# Altium footprint library Miscellaneous THD.PcbLib: 216 footprints (part 8 of 15) (continued)
## JYEBAO_SMA8410L-0000 [mm] "50 Ohm SMA Straight PCB Jack"
height 22.87
pads (5):
  round 2.2 hole 1.5: 1(0,0) 2(-2.54,-2.54) 2(-2.54,2.54) 2(2.54,-2.54) 2(2.54,2.54)
Top Overlay:
  circle w0.2: c0,0 r5.1
  lines w0.2: -3.574,-1.518 -4.45,0 -3.574,1.518 ; -2.236,-1.118 cw(c0,0) -2.236,1.118 ; -1.957,-1.208 cw(c0,0) -1.957,1.208 ; -1.917,-3.854 1.917,-3.854 ; -1.917,3.854 1.917,3.854 ; -1.208,-1.957 ccw(c0,0) 1.208,-1.957 ; -1.208,1.957 cw(c0,0) 1.208,1.957 ; -1.118,-2.236 ccw(c0,0) 1.118,-2.236 ; -1.118,2.236 cw(c0,0) 1.118,2.236 ; 1.957,-1.208 ccw(c0,0) 1.957,1.208 ; 2.236,-1.118 ccw(c0,0) 2.236,1.118 ; 3.574,-1.518 4.45,0 3.574,1.518
Mechanical 8:
  circle w0.1: c0,0 r1.454
  circle w0.1: c-2.54,-2.54 r1.1
  circle w0.1: c-2.54,-2.54 r0.75
  lines w0.1: -3.04,-2.54 -2.54,-2.54 ; -3.04,2.54 -2.54,2.54 ; -2.54,-3.04 -2.54,-2.54 ; -2.54,-2.04 -2.54,-2.54 ; -2.54,2.04 -2.54,2.54 ; -2.54,3.04 -2.54,2.54 ; -2.04,-2.54 -2.54,-2.54 ; -2.04,2.54 -2.54,2.54 ; -0.5,0 0,0 ; 0,-0.5 0,0 ; 0,0.5 0,0 ; 0.5,0 0,0 ; 2.04,-2.54 2.54,-2.54 ; 2.04,2.54 2.54,2.54 ; 2.54,-3.04 2.54,-2.54 ; 2.54,-2.04 2.54,-2.54 ; 2.54,2.04 2.54,2.54 ; 2.54,3.04 2.54,2.54 ; 3.04,-2.54 2.54,-2.54 ; 3.04,2.54 2.54,2.54
Mechanical 14:
  circle w0.1: c0,0 r2.3
  circle w0.1: c0,0 r2.5
  circle w0.1: c0,0 r0.6
  circle w0.1: c0,0 r2.3
  circle w0.1: c0,0 r5.1
  lines w0.1: -4.45,0 -2.225,3.854 2.225,3.854 4.45,0 2.225,-3.854 -2.225,-3.854 -4.45,0
3D body "JYEBAO_SMA8410L-0000_Part2.stp": height 17.8, standoff 14.6, extent -5.1,-5.099 5.1,5.099
3D body "JYEBAO_SMA8410L-0000_Part1.stp": height 22.87, standoff -3.94, extent -3.5,-3.5 3.5,3.5

## KEL_8901-068-177L-0046 [mm] "68 Positions, Pitch 1.27mm, Right angle PCB Receptacle With flanges and hooks"
height 7
pads (70):
  round 1.5 hole 0.8: 1(-20.955,0) 3(-19.685,1.905) 5(-18.415,0) 7(-17.145,1.905) 9(-15.875,0) 11(-14.605,1.905) 13(-13.335,0) 15(-12.065,1.905) 17(-10.795,0) 19(-9.525,1.905) 21(-8.255,0) 23(-6.985,1.905) 25(-5.715,0) 27(-4.445,1.905) 29(-3.175,0) 31(-1.905,1.905) 33(-0.635,0) 35(0.635,1.905) 37(1.905,0) 39(3.175,1.905) 41(4.445,0) 43(5.715,1.905) 45(6.985,0) 47(8.255,1.905) 49(9.525,0) 51(10.795,1.905) 53(12.065,0) 55(13.335,1.905) 57(14.605,0) 59(15.875,1.905) 61(17.145,0) 63(18.415,1.905) 65(19.685,0) 67(20.955,1.905)
  round 1.1 hole 0.65: 2(-20.955,-1.905) 4(-19.685,-1.905) 6(-18.415,-1.905) 8(-17.145,-1.905) 10(-15.875,-1.905) 12(-14.605,-1.905) 14(-13.335,-1.905) 16(-12.065,-1.905) 18(-10.795,-1.905) 20(-9.525,-1.905) 22(-8.255,-1.905) 24(-6.985,-1.905) 26(-5.715,-1.905) 28(-4.445,-1.905) 30(-3.175,-1.905) 32(-1.905,-1.905) 34(-0.635,-1.905) 36(0.635,-1.905) 38(1.905,-1.905) 40(3.175,-1.905) 42(4.445,-1.905) 44(5.715,-1.905) 46(6.985,-1.905) 48(8.255,-1.905) 50(9.525,-1.905) 52(10.795,-1.905) 54(12.065,-1.905) 56(13.335,-1.905) 58(14.605,-1.905) 60(15.875,-1.905) 62(17.145,-1.905) 64(18.415,-1.905) 66(19.685,-1.905) 68(20.955,-1.905)
  round 3 hole 2.3: 69(-25.4,0) 70(25.4,0)
Top Overlay:
  lines w0.2: -27.955,-2.105 -23.955,-2.105 -23.955,-1.155 ; -26.955,-5.635 -26.955,-2.105 ; -23.955,-7.105 23.955,-7.105 ; -23.955,-4.105 -23.955,-7.905 -23.155,-7.905 -23.155,-4.105 ; -23.955,1.155 -23.955,2.895 ; -22.43,2.895 -22.43,-2.905 22.43,-2.905 22.43,2.895 ; -20.164,2.895 -27.955,2.895 -27.955,-5.635 -25.855,-5.635 -25.855,-4.105 25.855,-4.105 25.855,-5.635 27.955,-5.635 27.955,2.895 21.434,2.895 ; 23.155,-4.105 23.155,-7.905 23.955,-7.905 23.955,-4.105 ; 23.955,-1.155 23.955,-2.105 27.955,-2.105 ; 23.955,1.155 23.955,2.895 ; -21.455,-3.15 -20.955,-4.15 -20.455,-3.15 -21.455,-3.15
Mechanical 8:
  drawing of 536 lines, arcs and shapes, not listed
  text "PCB Edge" at -3.81,-5.08 h1
Mechanical 14:
  lines w0.1: -27.955,-2.105 -23.955,-2.105 -23.955,2.895 ; -26.955,-5.635 -26.955,-2.105 ; -23.955,-7.105 23.955,-7.105 ; -23.955,-4.105 -23.955,-7.905 -23.155,-7.905 -23.155,-4.105 ; -22.43,2.895 -22.43,-2.905 22.43,-2.905 22.43,2.895 ; -21.155,-2.905 -21.155,0.125 -20.755,0.125 -20.755,-2.905 ; -19.885,-2.905 -19.885,2.016 -19.485,2.03 -19.485,-2.905 ; -18.615,-2.905 -18.615,0.125 -18.215,0.125 -18.215,-2.905 ; -17.345,-2.905 -17.345,2.016 -16.945,2.03 -16.945,-2.905 ; -16.075,-2.905 -16.075,0.125 -15.675,0.125 -15.675,-2.905 ; -14.805,-2.905 -14.805,2.016 -14.405,2.03 -14.405,-2.905 ; -13.535,-2.905 -13.535,0.125 -13.135,0.125 -13.135,-2.905 ; -12.265,-2.905 -12.265,2.016 -11.865,2.03 -11.865,-2.905 ; -10.995,-2.905 -10.995,0.125 -10.595,0.125 -10.595,-2.905 ; -9.725,-2.905 -9.725,2.03 -9.325,2.03 -9.325,-2.905 ; -8.455,-2.905 -8.455,0.125 -8.055,0.125 -8.055,-2.905 ; -7.185,-2.905 -7.185,2.016 -6.785,2.03 -6.785,-2.905 ; -5.915,-2.905 -5.915,0.125 -5.515,0.125 -5.515,-2.905 ; -4.645,-2.905 -4.645,2.03 -4.245,2.03 -4.245,-2.905 ; -3.375,-2.905 -3.375,0.125 -2.975,0.125 -2.975,-2.905 ; -2.105,-2.905 -2.105,2.016 -1.705,2.03 -1.705,-2.905 ; -0.835,-2.905 -0.835,0.125 -0.435,0.125 -0.435,-2.905 ; 0.435,-2.905 0.435,2.03 0.835,2.03 0.835,-2.905 ; 1.705,-2.905 1.705,0.125 2.105,0.125 2.105,-2.905 ; 2.975,-2.905 2.975,2.016 3.375,2.03 3.375,-2.905 ; 4.245,-2.905 4.245,0.125 4.645,0.125 4.645,-2.905 ; 5.515,-2.905 5.515,2.03 5.915,2.03 5.915,-2.905 ; 6.785,-2.905 6.785,0.125 7.185,0.125 7.185,-2.905 ; 8.055,-2.905 8.055,2.016 8.455,2.03 8.455,-2.905 ; 9.325,-2.905 9.325,0.125 9.725,0.125 9.725,-2.905 ; 10.595,-2.905 10.595,2.03 10.995,2.03 10.995,-2.905 ; 11.865,-2.905 11.865,0.125 12.265,0.125 12.265,-2.905 ; 13.135,-2.905 13.135,2.016 13.535,2.03 13.535,-2.905 ; 14.405,-2.905 14.405,0.125 14.805,0.125 14.805,-2.905 ; 15.675,-2.905 15.675,2.03 16.075,2.03 16.075,-2.905 ; 16.945,-2.905 16.945,0.125 17.345,0.125 17.345,-2.905 ; 18.215,-2.905 18.215,2.016 18.615,2.03 18.615,-2.905 ; 19.485,-2.905 19.485,0.125 19.885,0.125 19.885,-2.905 ; 20.755,-2.905 20.755,2.03 21.155,2.03 21.155,-2.905 ; 23.155,-4.105 23.155,-7.905 23.955,-7.905 23.955,-4.105 ; 23.955,2.895 23.955,-2.105 27.955,-2.105 ; -27.955,-5.635 -25.855,-5.635 -25.855,-4.105 25.855,-4.105 25.855,-5.635 27.955,-5.635 27.955,2.895 -27.955,2.895 -27.955,-5.635 ; -21.455,-3.15 -20.955,-4.15 -20.455,-3.15 -21.455,-3.15
3D body "KEL_8901-068-177L-0046.stp": height 7.05, standoff -3, extent -27.955,-7.905 27.955,2.895

## KEL_8931E-068-178L-F [mm] "68 Positions, Pitch 1.27mm, Right angle PCB Plug"
height 7
pads (70):
  round 1.5 hole 0.8: 1(20.955,1.905) 3(19.685,0) 5(18.415,1.905) 7(17.145,0) 9(15.875,1.905) 11(14.605,0) 13(13.335,1.905) 15(12.065,0) 17(10.795,1.905) 19(9.525,0) 21(8.255,1.905) 23(6.985,0) 25(5.715,1.905) 27(4.445,0) 29(3.175,1.905) 31(1.905,0) 33(0.635,1.905) 35(-0.635,0) 37(-1.905,1.905) 39(-3.175,0) 41(-4.445,1.905) 43(-5.715,0) 45(-6.985,1.905) 47(-8.255,0) 49(-9.525,1.905) 51(-10.795,0) 53(-12.065,1.905) 55(-13.335,0) 57(-14.605,1.905) 59(-15.875,0) 61(-17.145,1.905) 63(-18.415,0) 65(-19.685,1.905) 67(-20.955,0)
  round 1.1 hole 0.65: 2(20.955,-1.905) 4(19.685,-1.905) 6(18.415,-1.905) 8(17.145,-1.905) 10(15.875,-1.905) 12(14.605,-1.905) 14(13.335,-1.905) 16(12.065,-1.905) 18(10.795,-1.905) 20(9.525,-1.905) 22(8.255,-1.905) 24(6.985,-1.905) 26(5.715,-1.905) 28(4.445,-1.905) 30(3.175,-1.905) 32(1.905,-1.905) 34(0.635,-1.905) 36(-0.635,-1.905) 38(-1.905,-1.905) 40(-3.175,-1.905) 42(-4.445,-1.905) 44(-5.715,-1.905) 46(-6.985,-1.905) 48(-8.255,-1.905) 50(-9.525,-1.905) 52(-10.795,-1.905) 54(-12.065,-1.905) 56(-13.335,-1.905) 58(-14.605,-1.905) 60(-15.875,-1.905) 62(-17.145,-1.905) 64(-18.415,-1.905) 66(-19.685,-1.905) 68(-20.955,-1.905)
  round 3 hole 2.3: 69(-25.4,0) 70(25.4,0)
Top Overlay:
  lines w0.2: -22.355,2.895 -22.355,-2.905 22.355,-2.905 22.355,2.895 ; -20.164,2.895 -27.955,2.895 -27.955,-7.105 27.955,-7.105 27.955,2.895 21.434,2.895 ; 20.455,-3.805 21.455,-3.805 20.955,-4.805 20.455,-3.805
  text "1" at 21.455,3.512 h1
Mechanical 8:
  drawing of 304 lines, arcs and shapes, not listed
  text "PCB Edge" at -6.396,-5.115 h1
Mechanical 14:
  lines w0.1: -22.355,2.895 -22.355,-2.905 22.355,-2.905 22.355,2.895 ; -21.155,-2.905 -21.155,0.125 -20.755,0.125 -20.755,-2.905 ; -19.885,-2.905 -19.885,2.016 -19.485,2.03 -19.485,-2.905 ; -18.615,-2.905 -18.615,0.125 -18.215,0.125 -18.215,-2.905 ; -17.345,-2.905 -17.345,2.016 -16.945,2.03 -16.945,-2.905 ; -16.075,-2.905 -16.075,0.125 -15.675,0.125 -15.675,-2.905 ; -14.805,-2.905 -14.805,2.016 -14.405,2.03 -14.405,-2.905 ; -13.535,-2.905 -13.535,0.125 -13.135,0.125 -13.135,-2.905 ; -12.265,-2.905 -12.265,2.016 -11.865,2.03 -11.865,-2.905 ; -10.995,-2.905 -10.995,0.125 -10.595,0.125 -10.595,-2.905 ; -9.725,-2.905 -9.725,2.03 -9.325,2.03 -9.325,-2.905 ; -8.455,-2.905 -8.455,0.125 -8.055,0.125 -8.055,-2.905 ; -7.185,-2.905 -7.185,2.016 -6.785,2.03 -6.785,-2.905 ; -5.915,-2.905 -5.915,0.125 -5.515,0.125 -5.515,-2.905 ; -4.645,-2.905 -4.645,2.03 -4.245,2.03 -4.245,-2.905 ; -3.375,-2.905 -3.375,0.125 -2.975,0.125 -2.975,-2.905 ; -2.105,-2.905 -2.105,2.016 -1.705,2.03 -1.705,-2.905 ; -0.835,-2.905 -0.835,0.125 -0.435,0.125 -0.435,-2.905 ; 0.435,-2.905 0.435,2.03 0.835,2.03 0.835,-2.905 ; 1.705,-2.905 1.705,0.125 2.105,0.125 2.105,-2.905 ; 2.975,-2.905 2.975,2.016 3.375,2.03 3.375,-2.905 ; 4.245,-2.905 4.245,0.125 4.645,0.125 4.645,-2.905 ; 5.515,-2.905 5.515,2.03 5.915,2.03 5.915,-2.905 ; 6.785,-2.905 6.785,0.125 7.185,0.125 7.185,-2.905 ; 8.055,-2.905 8.055,2.016 8.455,2.03 8.455,-2.905 ; 9.325,-2.905 9.325,0.125 9.725,0.125 9.725,-2.905 ; 10.595,-2.905 10.595,2.03 10.995,2.03 10.995,-2.905 ; 11.865,-2.905 11.865,0.125 12.265,0.125 12.265,-2.905 ; 13.135,-2.905 13.135,2.016 13.535,2.03 13.535,-2.905 ; 14.405,-2.905 14.405,0.125 14.805,0.125 14.805,-2.905 ; 15.675,-2.905 15.675,2.03 16.075,2.03 16.075,-2.905 ; 16.945,-2.905 16.945,0.125 17.345,0.125 17.345,-2.905 ; 18.215,-2.905 18.215,2.016 18.615,2.03 18.615,-2.905 ; 19.485,-2.905 19.485,0.125 19.885,0.125 19.885,-2.905 ; 20.755,-2.905 20.755,2.03 21.155,2.03 21.155,-2.905 ; -27.955,-7.105 -27.955,2.895 27.955,2.895 27.955,-7.105 -27.955,-7.105 ; 20.455,-3.805 21.455,-3.805 20.955,-4.805 20.455,-3.805
  text "1" at 21.455,3.512 h1
3D body "KEL_8931E-068-178L-F.stp": height 7.05, standoff -3, extent -27.955,-7.105 27.955,2.895

## KYCON_KPJX-4S-S [mm] "48VDC 7.5A, 4 Position Shielded DC Power Jack"
height 15
pads (11):
  oval 1.3x3.4 hole 0.6 slot 2.7 at 90 deg: 1(2.9,-3.65) 2(-2.9,-3.65) 3(2.5,0) 4(-2.5,0) SHIELD(-7.8,-5) SHIELD(7.8,-5)
  round 1 hole 1.7 unplated mask+0.35: MECH(-2.5,3.5) MECH(2.5,3.5)
  round 2.9 hole 2.2: SHIELD(-7.8,3.5) SHIELD(7.8,3.5)
  oval 2.9x1.7 hole 1 slot 2.2 at 0 deg: SHIELD(0,5.5)
Top Overlay:
  circle w0.2: c0,-3.65 r1.725
  lines w0.2: -8,-6.1 -7.9,-6.1 -7.9,-6.5 6.851,-6.5 ; -8,-2.919 -8,1.661 ; -8,5.339 -8,6.99 8,6.99 8,5.339 ; -6.4,7 -6.4,11 6.4,11 6.4,7 ; 8,-2.919 8,1.661
  text "1" at 2.775,-8.075 h1
Mechanical 8:
  circle w0.1: c7.8,3.5 r1.85
  circle w0.1: c-7.8,3.5 r1.85
  circle w0.1: c-7.8,3.5 r1.45
  circle w0.1: c7.8,3.5 r1.45
  circle w0.1: c-7.8,3.5 r1.1
  circle w0.1: c7.8,3.5 r1.1
  circle w0.1: c-2.5,3.5 r1.2
  circle w0.1: c2.5,3.5 r1.2
  circle w0.1: c-2.5,3.5 r0.85
  circle w0.1: c2.5,3.5 r0.85
  lines w0.1: -8.3,-5 -7.8,-5 ; -8.3,3.5 -7.8,3.5 ; -7.8,-6.05 -7.5,-6.05 ; -7.8,-5.5 -7.8,-5 ; -7.8,-4.5 -7.8,-5 ; -7.8,-3.95 -7.5,-3.95 ; -7.8,3 -7.8,3.5 ; -7.8,4 -7.8,3.5 ; -7.3,-5 -7.8,-5 ; -7.3,3.5 -7.8,3.5 ; -3.4,-3.65 -2.9,-3.65 ; -3,0 -2.5,0 ; -3,3.5 -2.5,3.5 ; -2.9,-4.7 -2.6,-4.7 ; -2.9,-4.15 -2.9,-3.65 ; -2.9,-3.15 -2.9,-3.65 ; -2.9,-2.6 -2.6,-2.6 ; -2.5,-1.05 -2.2,-1.05 ; -2.5,-0.5 -2.5,0 ; -2.5,0.5 -2.5,0 ; -2.5,1.05 -2.2,1.05 ; -2.5,3 -2.5,3.5 ; -2.5,4 -2.5,3.5 ; -2.4,-3.65 -2.9,-3.65 ; -2,0 -2.5,0 ; -2,3.5 -2.5,3.5 ; -0.6,5.5 -0.6,6 ; -0.5,0 0,0 ; -0.5,5.5 0,5.5 ; 0,-0.5 0,0 ; 0,0.5 0,0 ; 0,3.5 0,11 0,5.5 ; 0,5 0,5.5 ; 0,6 0,5.5 ; 0.5,0 0,0 ; 0.5,5.5 0,5.5 ; 0.6,5.5 0.6,6 ; 2,0 2.5,0 ; 2,3.5 2.5,3.5 ; 2.4,-3.65 2.9,-3.65 ; 2.5,-1.05 2.8,-1.05 ; 2.5,-0.5 2.5,0 ; 2.5,0.5 2.5,0 ; 2.5,1.05 2.8,1.05 ; 2.5,3 2.5,3.5 ; 2.5,4 2.5,3.5 ; 2.9,-4.7 3.2,-4.7 ; 2.9,-4.15 2.9,-3.65 ; 2.9,-3.15 2.9,-3.65 ; 2.9,-2.6 3.2,-2.6 ; 3,0 2.5,0 ; 3,3.5 2.5,3.5 ; 3.4,-3.65 2.9,-3.65 ; 3.807,-4.145 4.202,-4.145 ; 4.005,-4.145 4.005,-3.078 4.187,-3.386 ; 7.3,-5 7.8,-5 ; 7.3,3.5 7.8,3.5 ; 7.8,-6.05 8.1,-6.05 ; 7.8,-5.5 7.8,-5 ; 7.8,-4.5 7.8,-5 ; 7.8,-3.95 8.1,-3.95 ; 7.8,3 7.8,3.5 ; 7.8,4 7.8,3.5 ; 8.3,-5 7.8,-5 ; 8.3,3.5 7.8,3.5 ; -7.5,-6.05 cw(c-7.8,-6.05) -8.1,-6.05 -8.1,-3.95 cw(c-7.8,-3.95) -7.5,-3.95 ; -7.5,-6.05 -7.5,-3.95 ; -2.6,-4.7 cw(c-2.9,-4.7) -3.2,-4.7 -3.2,-2.6 cw(c-2.9,-2.6) -2.6,-2.6 ; -2.6,-4.7 -2.6,-2.6 ; -2.2,-1.05 cw(c-2.5,-1.05) -2.8,-1.05 -2.8,1.05 cw(c-2.5,1.05) -2.2,1.05 ; -2.2,-1.05 -2.2,1.05 ; -0.6,6 ccw(c-0.6,5.5) -0.6,5 0.6,5 ccw(c0.6,5.5) 0.6,6 ; -0.6,6 0.6,6 ; 2.8,-1.05 cw(c2.5,-1.05) 2.2,-1.05 2.2,1.05 cw(c2.5,1.05) 2.8,1.05 ; 2.8,-1.05 2.8,1.05 ; 3.2,-4.7 cw(c2.9,-4.7) 2.6,-4.7 2.6,-2.6 cw(c2.9,-2.6) 3.2,-2.6 ; 3.2,-4.7 3.2,-2.6 ; 8.1,-6.05 cw(c7.8,-6.05) 7.5,-6.05 7.5,-3.95 cw(c7.8,-3.95) 8.1,-3.95 ; 8.1,-6.05 8.1,-3.95 ; -8.85,-6.05 ccw(c-7.8,-6.05) -6.75,-6.05 -6.75,-3.95 ccw(c-7.8,-3.95) -8.85,-3.95 -8.85,-6.05 ; -8.45,-6.05 ccw(c-7.8,-6.05) -7.15,-6.05 -7.15,-3.95 ccw(c-7.8,-3.95) -8.45,-3.95 -8.45,-6.05 ; -3.55,-4.7 ccw(c-2.9,-4.7) -2.25,-4.7 -2.25,-2.6 ccw(c-2.9,-2.6) -3.55,-2.6 -3.55,-4.7 ; -3.15,-1.05 ccw(c-2.5,-1.05) -1.85,-1.05 -1.85,1.05 ccw(c-2.5,1.05) -3.15,1.05 -3.15,-1.05 ; -0.6,4.65 cw(c-0.6,5.5) -0.6,6.35 0.6,6.35 cw(c0.6,5.5) 0.6,4.65 -0.6,4.65 ; 1.85,-1.05 ccw(c2.5,-1.05) 3.15,-1.05 3.15,1.05 ccw(c2.5,1.05) 1.85,1.05 1.85,-1.05 ; 2.25,-4.7 ccw(c2.9,-4.7) 3.55,-4.7 3.55,-2.6 ccw(c2.9,-2.6) 2.25,-2.6 2.25,-4.7 ; 6.75,-6.05 ccw(c7.8,-6.05) 8.85,-6.05 8.85,-3.95 ccw(c7.8,-3.95) 6.75,-3.95 6.75,-6.05 ; 7.15,-6.05 ccw(c7.8,-6.05) 8.45,-6.05 8.45,-3.95 ccw(c7.8,-3.95) 7.15,-3.95 7.15,-6.05
Mechanical 14:
  circle w0.1: c0,-3.65 r1.725
  lines w0.1: -6.4,7 -6.4,11 6.4,11 6.4,7 ; -8,-6.1 -8,6.99 8,6.99 8,-6.1 7.9,-6.1 7.9,-6.5 -7.9,-6.5 -7.9,-6.1 -8,-6.1
  text "2" at -4.65,-4.075 h1
  text "4" at -4.25,-0.425 h1
  text "3" at 3.6,-0.5 h1
  text "1" at 4.005,-4.145 h1
3D body "KYCON_KPJX-4S-S.stp": height 15, standoff -3.5, extent -8,-6.5 8,11

## MHCONNECTORS_3700-0121-01 [mm] "68 contacts, Pitch .050\", Right Angled  SCSI Header (Threaded  M2.5)"
height 9.4
pads (70):
  round 3.5 hole 2.8: 69(-28.965,-0.953) 70(28.965,-0.953)
  round 1.55 hole 0.85: A1(-20.955,2.858) A2(-19.685,0.953) A3(-18.415,2.858) A4(-17.145,0.953) A5(-15.875,2.858) A6(-14.605,0.953) A7(-13.335,2.858) A8(-12.065,0.952) A9(-10.795,2.858) A10(-9.525,0.953) A11(-8.255,2.858) A12(-6.985,0.953) A13(-5.715,2.858) A14(-4.445,0.953) A15(-3.175,2.858) A16(-1.905,0.953) A17(-0.635,2.858) A18(0.635,0.953) A19(1.905,2.858) A20(3.175,0.953) A21(4.445,2.858) A22(5.715,0.953) A23(6.985,2.858) A24(8.255,0.953) A25(9.525,2.858) A26(10.795,0.953) A27(12.065,2.858) A28(13.335,0.953) A29(14.605,2.858) A30(15.875,0.953) A31(17.145,2.858) A32(18.415,0.953) A33(19.685,2.858) A34(20.955,0.953) B1(-20.955,-0.953) B2(-19.685,-2.858) B3(-18.415,-0.953) B4(-17.145,-2.858) B5(-15.875,-0.953) B6(-14.605,-2.858) B7(-13.335,-0.953) B8(-12.065,-2.858) B9(-10.795,-0.953) B10(-9.525,-2.858) B11(-8.255,-0.953) B12(-6.985,-2.858) B13(-5.715,-0.953) B14(-4.445,-2.858) B15(-3.175,-0.953) B16(-1.905,-2.858) B17(-0.635,-0.953) B18(0.635,-2.858) B19(1.905,-0.953) B20(3.175,-2.858) B21(4.445,-0.953) B22(5.715,-2.858) B23(6.985,-0.953) B24(8.255,-2.858) B25(9.525,-0.953) B26(10.795,-2.858) B27(12.065,-0.953) B28(13.335,-2.858) B29(14.605,-0.953) B30(15.875,-2.858) B31(17.145,-0.953) B32(18.415,-2.858) B33(19.685,-0.953) B34(20.955,-2.858)
Top Overlay:
  circle w0.3: c-20.9,4.75 r0.15
  lines w0.2: -32.08,-4.108 32.08,-4.108 ; -26.28,-4.108 -26.28,0.393 -24.5,0.393 ; -25.6,-7.658 -25.6,-11.358 -26.7,-11.358 -26.7,-12.057 -25.6,-12.057 ccw(c-25.6,-11.358) -24.9,-11.358 -24.886,-7.658 ; -23.69,-7.658 -23.69,-12.207 ccw(c-23.14,-12.207) -23.14,-12.757 23.14,-12.758 ccw(c23.14,-12.207) 23.69,-12.207 23.69,-7.658 ; 24.9,-7.658 24.9,-11.358 ccw(c25.6,-11.358) 25.6,-12.058 26.7,-12.057 26.7,-11.358 25.6,-11.358 25.6,-7.658 ; 25.9,0.393 26.65,0.393 26.65,-4.108 ; -32.08,-7.658 32.08,-7.658 32.08,4.243 -32.08,4.243 -32.08,-7.658
  text "A34" at 22.4,0.485 h1
  text "B33" at 22.4,-1.415 h1
  text "B34" at 22.4,-3.365 h1
  text "A33" at 22.4,2.335 h1
  text "B2" at -23.65,-3.25 h1
  text "A1" at -23.65,2.25 h1
  text "A2" at -23.65,0.5 h1
  text "B1" at -23.65,-1.5 h1
Mechanical 8:
  drawing of 286 lines, arcs and shapes, not listed
Mechanical 14:
  lines w0.1: -32.08,-4.108 32.08,-4.108 ; -26.28,-4.108 -26.28,0.393 -23.85,0.393 -23.85,-4.108 ; -25.6,-7.658 -25.6,-11.358 -26.7,-11.358 -26.7,-12.057 -25.6,-12.057 ccw(c-25.6,-11.358) -24.9,-11.358 -24.886,-7.658 ; -23.69,-7.658 -23.69,-12.207 ccw(c-23.14,-12.207) -23.14,-12.757 23.14,-12.758 ccw(c23.14,-12.207) 23.69,-12.207 23.69,-7.658 ; -21.18,-4.108 -21.18,3.057 -20.73,3.057 -20.73,-4.108 ; -19.91,-4.108 -19.91,1.152 -19.46,1.152 -19.46,-4.108 ; -18.64,-4.108 -18.64,3.057 -18.19,3.057 -18.19,-4.108 ; -17.37,-4.108 -17.37,1.152 -16.92,1.152 -16.92,-4.108 ; -16.1,-4.108 -16.1,3.057 -15.65,3.057 -15.65,-4.108 ; -14.83,-4.108 -14.83,1.152 -14.38,1.152 -14.38,-4.108 ; -13.56,-4.108 -13.56,3.057 -13.11,3.057 -13.11,-4.108 ; -12.29,-4.108 -12.29,1.152 -11.84,1.152 -11.84,-4.108 ; -11.02,-4.108 -11.02,3.057 -10.57,3.057 -10.57,-4.108 ; -9.75,-4.108 -9.75,1.152 -9.3,1.152 -9.3,-4.108 ; -8.48,-4.108 -8.48,3.057 -8.03,3.057 -8.03,-4.108 ; -7.21,-4.108 -7.21,1.152 -6.76,1.152 -6.76,-4.108 ; -5.94,-4.108 -5.94,3.057 -5.49,3.057 -5.49,-4.108 ; -4.67,-4.108 -4.67,1.152 -4.22,1.152 -4.22,-4.108 ; -3.4,-4.108 -3.4,3.057 -2.95,3.057 -2.95,-4.108 ; -2.13,-4.108 -2.13,1.152 -1.68,1.152 -1.68,-4.108 ; -0.86,-4.108 -0.86,3.057 -0.41,3.057 -0.41,-4.108 ; 0.41,-4.108 0.41,1.152 0.86,1.152 0.86,-4.108 ; 1.68,-4.108 1.68,3.057 2.13,3.057 2.13,-4.108 ; 2.95,-4.108 2.95,1.152 3.4,1.152 3.4,-4.108 ; 4.22,-4.108 4.22,3.057 4.67,3.057 4.67,-4.108 ; 5.49,-4.108 5.49,1.152 5.94,1.152 5.94,-4.108 ; 6.76,-4.108 6.76,3.057 7.21,3.057 7.21,-4.108 ; 8.03,-4.108 8.03,1.152 8.48,1.152 8.48,-4.108 ; 9.3,-4.108 9.3,3.057 9.75,3.057 9.75,-4.108 ; 10.57,-4.108 10.57,1.152 11.02,1.152 11.02,-4.108 ; 11.84,-4.108 11.84,3.057 12.29,3.057 12.29,-4.108 ; 13.11,-4.108 13.11,1.152 13.56,1.152 13.56,-4.108 ; 14.38,-4.108 14.38,3.057 14.83,3.057 14.83,-4.108 ; 15.65,-4.108 15.65,1.152 16.1,1.152 16.1,-4.108 ; 16.92,-4.108 16.92,3.057 17.37,3.057 17.37,-4.108 ; 18.19,-4.108 18.19,1.152 18.64,1.152 18.64,-4.108 ; 19.46,-4.108 19.46,3.057 19.91,3.057 19.91,-4.108 ; 20.73,-4.108 20.73,1.152 21.18,1.152 21.18,-4.108 ; 23.85,-4.108 23.85,0.393 26.65,0.393 26.65,-4.108 ; 24.9,-7.658 24.9,-11.358 ccw(c25.6,-11.358) 25.6,-12.058 26.7,-12.057 26.7,-11.358 25.6,-11.358 25.6,-7.658 ; -32.08,-7.658 32.08,-7.658 32.08,4.243 -32.08,4.243 -32.08,-7.658
  text "A34" at 22.4,0.485 h1.02
  text "B33" at 22.4,-1.415 h1.02
  text "B34" at 22.4,-3.365 h1.02
  text "A33" at 22.4,2.335 h1.02
  text "B2" at -23.65,-3.25 h1.02
  text "A1" at -23.65,2.25 h1.02
  text "A2" at -23.65,0.5 h1.02
  text "B1" at -23.65,-1.5 h1.02
3D body "MHCONNECTORS_3700-0121-01.stp": height 9.4, standoff -3.8, extent -32.08,-12.758 32.08,4.243

## MHCONNECTORS_MHRJJ66NFRA [mm] "RJ12 Connector, 6P6C, MHRJJ Series, Right Angle With Ears"
height 16
pads (8):
  round 1.6 hole 0.9: 1(3.175,-1.27) 2(1.905,1.27) 3(0.635,-1.27) 4(-0.635,1.27) 5(-1.905,-1.27) 6(-3.175,1.27)
  round 1 hole 3.2 unplated mask+1.1: M1(-5.08,7.62) M2(5.08,7.62)
Top Overlay:
  lines w0.2: -6.605,1.27 -4.325,1.27 ; -6.605,5.645 -6.605,-2.27 -2.535,-2.27 ; -6.605,9.595 -6.605,18.33 6.605,18.33 6.605,9.595 ; -1.275,-2.27 0.005,-2.27 ; 1.265,-2.27 2.545,-2.27 ; 3.055,1.27 6.605,1.27 ; 3.805,-2.27 6.605,-2.27 6.605,5.645
  text "1" at 3.145,-4.2 h1.2
Mechanical 8:
  circle w0.05: c1.905,1.27 r0.45
  circle w0.05: c-0.635,1.27 r0.45
  circle w0.05: c-3.175,1.27 r0.45
  circle w0.05: c3.175,-1.27 r0.45
  circle w0.05: c0.635,-1.27 r0.45
  circle w0.05: c-1.905,-1.27 r0.45
  circle w0.05: c5.08,7.62 r1.625
  circle w0.05: c-5.08,7.62 r1.625
  lines w0.05: -5.58,7.62 -5.08,7.62 ; -5.08,7.12 -5.08,7.62 ; -5.08,8.12 -5.08,7.62 ; -4.58,7.62 -5.08,7.62 ; -3.675,1.27 -3.175,1.27 ; -3.175,0.77 -3.175,1.27 ; -3.175,1.77 -3.175,1.27 ; -2.675,1.27 -3.175,1.27 ; -2.405,-1.27 -1.905,-1.27 ; -1.905,-1.77 -1.905,-1.27 ; -1.905,-0.77 -1.905,-1.27 ; -1.405,-1.27 -1.905,-1.27 ; -1.135,1.27 -0.635,1.27 ; -0.635,0.77 -0.635,1.27 ; -0.635,1.77 -0.635,1.27 ; -0.5,0 0,0 ; -0.135,1.27 -0.635,1.27 ; 0,-0.5 0,0 ; 0,0.5 0,0 ; 0.135,-1.27 0.635,-1.27 ; 0.5,0 0,0 ; 0.635,-1.77 0.635,-1.27 ; 0.635,-0.77 0.635,-1.27 ; 1.135,-1.27 0.635,-1.27 ; 1.405,1.27 1.905,1.27 ; 1.905,0.77 1.905,1.27 ; 1.905,1.77 1.905,1.27 ; 2.405,1.27 1.905,1.27 ; 2.675,-1.27 3.175,-1.27 ; 3.175,-1.77 3.175,-1.27 ; 3.175,-0.77 3.175,-1.27 ; 3.675,-1.27 3.175,-1.27 ; 4.58,7.62 5.08,7.62 ; 5.08,7.12 5.08,7.62 ; 5.08,8.12 5.08,7.62 ; 5.58,7.62 5.08,7.62
Mechanical 14:
  lines w0.1: -6.605,1.27 6.605,1.27 ; -6.605,-2.27 6.605,-2.27 6.605,18.33 -6.605,18.33 -6.605,8.62 -6.605,-2.27
  text "1" at 3.145,-4.2 h1.2
3D body "MHCONNECTORS_MHRJJ66NFRA.stp": height 16.01, standoff -3.6, extent -6.605,-2.27 6.605,18.33

## MIL-MAX_851-43-004-20-001000 [mm] "1.27mm Pitch SIL Right Angled Socket"
height 2.21
pads (4):
  rrect50% 1.1x1.1 hole 0.6: 1(-1.905,0) 2(-0.635,0) 3(0.635,0) 4(1.905,0)
Top Overlay:
  circle w0.3: c-3.058,0.003 r0.15
  lines w0.2: -2.129,0.923 -2.129,1.218 ; -1.68,0.923 -1.68,1.218 ; -0.859,0.923 -0.859,1.218 ; -0.41,0.923 -0.41,1.218 ; 0.41,0.923 0.41,1.218 ; 0.86,0.923 0.86,1.218 ; 1.68,0.923 1.68,1.218 ; 2.13,0.923 2.13,1.218 ; -2.731,1.218 -2.73,5.308 0,5.308 2.73,5.308 2.731,1.218 -2.731,1.218
Mechanical 8:
  lines w0.1: -2.405,0 -1.905,0 ; -1.905,-0.5 -1.905,0 ; -1.905,0.5 -1.905,0 ; -1.405,0 -1.905,0 ; -1.135,0 -0.635,0 ; -0.635,-0.5 -0.635,0 ; -0.635,0.5 -0.635,0 ; -0.354,-0.354 0,0 ; -0.354,0.354 0,0 ; -0.135,0 -0.635,0 ; 0.135,0 0.635,0 ; 0.354,-0.354 0,0 ; 0.354,0.354 0,0 ; 0.635,-0.5 0.635,0 ; 0.635,0.5 0.635,0 ; 1.135,0 0.635,0 ; 1.405,0 1.905,0 ; 1.905,-0.5 1.905,0 ; 1.905,0.5 1.905,0 ; 2.405,0 1.905,0
Mechanical 14:
  circle w0.3: c-3.058,0.003 r0.15
  lines w0.1: -2.129,1.218 -2.13,0 ccw(c-1.905,0) -1.68,0 -1.68,1.218 ; -0.859,1.218 -0.86,0 ccw(c-0.635,0) -0.41,0 -0.41,1.218 ; 0.41,1.218 0.41,0 ccw(c0.635,0) 0.86,0 0.86,1.218 ; 1.68,1.218 1.68,0 ccw(c1.905,0) 2.13,0 2.13,1.218 ; -2.731,1.218 -2.73,5.308 0,5.308 2.73,5.308 2.731,1.218 -2.731,1.218
3D body "MIL-MAX_851-43-004-20-001000.stp": height 2.21, standoff -3.6, extent -2.73,-0.225 2.731,5.308